# Altium footprint library GyokuRe.PcbLib: 1248 footprints (part 60 of 78)
Each footprint in its own frame and in the unit in brackets; x right, y up, seen from the top. Pads: shape width x height; smd on the part's side, far side on the other; paste and mask are expansions set on the pad; w line width, h text height; cw(c..) or ccw(c..) is an arc to the next point about the centre after c.
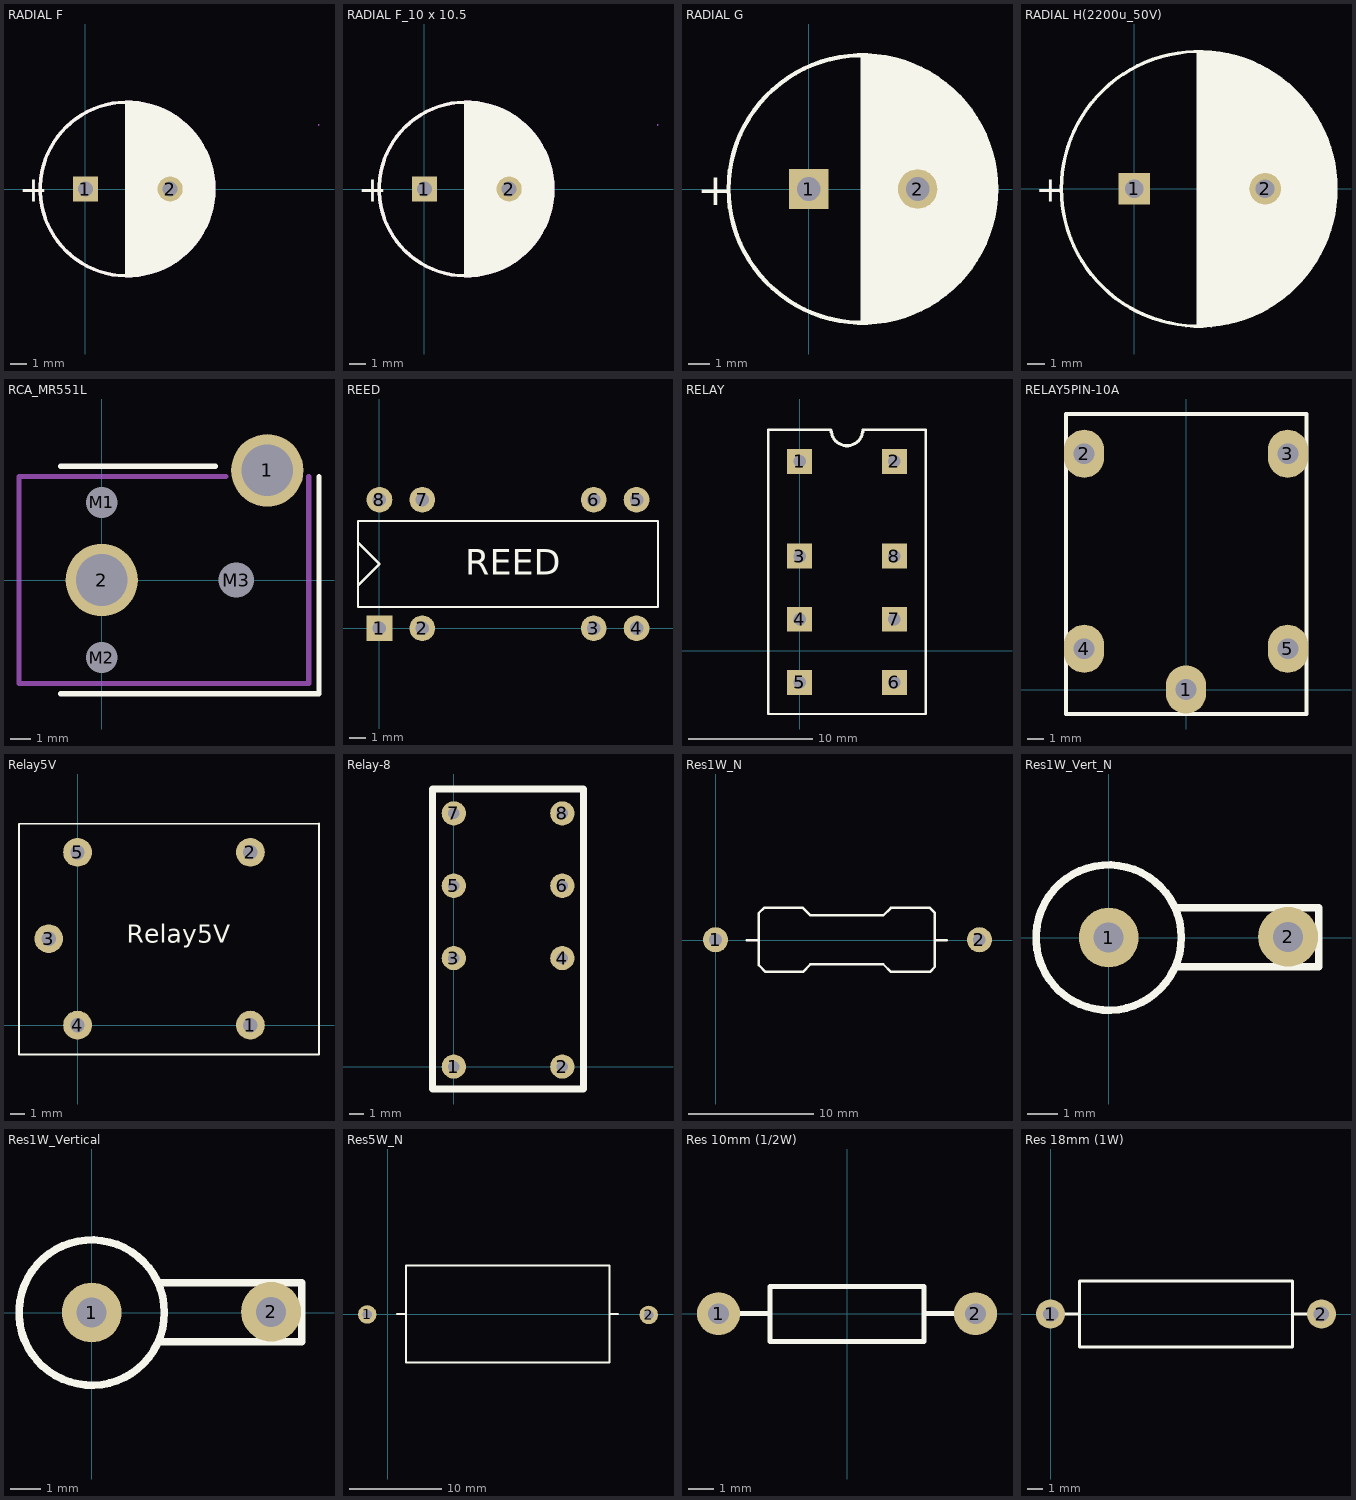
[diagram p59: the footprints below, top view; thin cyan lines are the x and y axes]

## RADIAL F [mm] "Capacitor, Electrolytic, Radial; Body 10 x 10.5 mm (Dia.xH typ); Pin Spacing 5 mm (typ)"
height 11.5
pads (2):
  rect 1.5x1.5 hole 0.9: 1(0,0)
  round 1.5 hole 0.9: 2(5.08,0)
Top Overlay:
  circle w0.2: c2.5,0 r5.207
  region: 2.489,-5.182 3.607,-5.08 4.826,-4.674 5.969,-3.835 7.01,-2.718 7.468,-1.6 7.747,-0.102 7.544,1.372 6.934,2.718 6.274,3.581 5.08,4.547 3.607,5.105 2.515,5.207 2.489,5.207
  lines w0.2: 2.489,5.182 2.489,-5.207 2.54,-5.207
  text "+" at -3.975,-0.75 h1.5
Bottom Overlay:
  circle w0.2: c2.5,0 r5.207
Mechanical 3:
  circle w0.025: c13.97,3.835 r0.025
Mechanical 13:
  circle w0.2: c2.5,0 r5.207
3D body: height 11.48, standoff 0.03, extent -2.54,-5.08 7.5,5.08
3D body: height 11.48, standoff 0.03, extent 7.239,-1.575 7.544,1.245
3D body: height 11.51, standoff 11.46, extent -1.401,-3.785 6.244,3.81
3D body: height 3, standoff 0, extent -0.25,-0.246 0.25,0.254
3D body: height 2, standoff 0, extent 4.83,-0.246 5.33,0.254

## RADIAL F_10 x 10.5 [mm] "Capacitor, Electrolytic, Radial; Body 10 x 10.5 mm (Dia.xH typ); Pin Spacing 5 mm (typ)"
height 11.5
pads (2):
  rect 1.5x1.5 hole 0.9: 1(0,0)
  round 1.5 hole 0.9: 2(5.08,0)
Top Overlay:
  circle w0.2: c2.5,0 r5.207
  region: 2.489,-5.182 3.607,-5.08 4.826,-4.674 5.969,-3.835 7.01,-2.718 7.468,-1.6 7.747,-0.102 7.544,1.372 6.934,2.718 6.274,3.581 5.08,4.547 3.607,5.105 2.515,5.207 2.489,5.207
  lines w0.2: 2.489,5.182 2.489,-5.207 2.54,-5.207
  text "+" at -3.975,-0.75 h1.5
Bottom Overlay:
  circle w0.2: c2.5,0 r5.207
Mechanical 3:
  circle w0.025: c13.97,3.835 r0.025
Mechanical 13:
  circle w0.2: c2.5,0 r5.207
3D body "CAP 10X20.STEP": height 19.99, standoff -19, extent -2.405,-5.004 7.595,4.996

## RADIAL G [mm] "Capacitor, Electrolytic, Radial; Body 12.5 x 22 mm (Dia.xH typ); Pin Spacing 5 mm (typ)"
height 23
pads (2):
  rect 1.85x1.85 hole 1.1: 1(0,0)
  round 1.85 hole 1.1: 2(5.08,0)
Top Overlay:
  circle w0.2: c2.5,0 r6.25
  region: 2.515,6.248 4.013,6.071 5.715,5.334 6.858,4.496 7.722,3.48 8.382,2.108 8.788,0.229 8.585,-1.448 7.95,-2.972 7.163,-4.14 6.071,-5.156 4.216,-6.02 2.489,-6.248
  lines w0.2: 2.515,-6.223 2.515,6.248
  text "+" at -5.225,-0.75 h1.5
Bottom Overlay:
  circle w0.2: c2.5,0 r6.25
  text "+" at -0.6,1.55 h1.5
3D body "Cap12_5x20.STEP": height 20.99, standoff -18, extent -3.658,-6.274 8.842,6.226

## RADIAL H(2200u_50V) [mm] "Capacitor, Electrolytic, Radial; Body 16 x 25 mm (Dia.xH typ); Pin Spacing 7.5 mm (typ)"
height 26
pads (2):
  rect 1.85x1.85 hole 1.1: 1(0,0)
  round 1.85 hole 1.1: 2(7.62,0)
Top Overlay:
  circle w0.2: c3.75,0 r8
  region: 3.759,7.976 5.41,7.823 7.264,7.137 8.941,6.121 10.516,4.242 11.608,1.753 11.735,-0.254 11.379,-2.337 10.719,-3.962 9.525,-5.563 8.052,-6.782 6.248,-7.645 4.445,-8.026 3.734,-7.95 3.734,8.001
  lines w0.2: 3.734,-7.976 3.734,7.976
  text "+" at -5.725,-0.75 h1.5
Bottom Overlay:
  circle w0.2: c3.75,0 r8
  text "+" at 1.895,-0.75 h1.5
3D body: height 32.12, standoff 0.09, extent 9.075,-3.15 11.85,3.025
3D body: height 32.01, standoff 0.11, extent -2.075,-5.775 9.55,5.775
3D body: height 32, standoff 0.1, extent -4.25,-8.025 11.825,8

## RCA_MR551L [mm] "Schurter RCA PCB Socket (Farnell 152-396)"
pads (5):
  round 3.5 hole 2.5: 1(8,5.3) 2(0,0)
  round 1.3 hole 1.5 unplated: M1(0,3.75) M2(0,-3.75)
  round 1.5 hole 1.7 unplated: M3(6.5,0)
Top Overlay:
  lines w0.254: -2,-5.5 10.5,-5.5 10.5,5 ; -2,5.5 5.5,5.5
Mechanical 1:
  lines w0.254: 6,5 -4,5 -4,-5 10,-5 10,5

## REED [mil]
pads (8):
  rect 60x60 hole 31.49: 1(0,0)
  round 60 hole 31.49: 2(100,0) 3(500,0) 4(600,0) 5(600,300) 6(500,300) 7(100,300) 8(0,300)
Top Overlay:
  lines w5: -50,100 0,150 -50,200 ; -50,50 650,50 650,250 -50,250 -50,50
  text "REED" at 200,125 h60

## RELAY [mm]
pads (8):
  rect 2x2 hole 1: 1(0,15.24) 2(7.62,15.24) 3(0,7.62) 4(0,2.54) 5(0,-2.54) 6(7.62,-2.54) 7(7.62,2.54) 8(7.62,7.62)
Top Overlay:
  lines w0.2: 2.413,17.78 -2.54,17.78 -2.54,-5.08 10.16,-5.08 10.16,17.78 5.08,17.78
  lines w0.254: 2.534,17.78 ccw(c3.81,17.78) 5.086,17.78
3D body "User Library-8PIN-Relay.step": height 12.3, standoff -3, extent -1.09,-4.05 8.71,16.75

## RELAY5PIN-10A [mm]
pads (5):
  oval 2.5x3 hole 1.3: 1(0,0) 2(-6.35,14.7) 3(6.35,14.7) 4(-6.35,2.54) 5(6.35,2.54)
Top Overlay:
  lines w0.254: -7.493,-1.524 7.507,-1.524 7.507,17.176 -7.493,17.176 -7.493,-1.524
3D body: height 16, standoff 0, extent -7.493,-1.524 7.493,17.145

## Relay5V [mm]
pads (5):
  round 2 hole 1 unplated: 1(12,0) 2(12,12) 3(-2,6) 4(0,0) 5(0,12)
Top Overlay:
  lines w0.127: -4.064,-2.032 16.764,-2.032 16.764,13.992 -4.064,13.957 -4.064,-2.032
  text "Relay5V" at 3.429,5.715 h1.27

## Relay-8 [mil] "Relay; 8 Leads; Solder Pad 35mil"
pads (8):
  round 67 hole 32: 1(0,0) 2(300,0) 3(0,300) 4(300,300) 5(0,500) 6(300,500) 7(0,700) 8(300,700)
Top Overlay:
  lines w19.68: -58.5,-62 -58.5,767.5 358,767.5 358,-62 -58.5,-62
3D body "User Library-OMRON G5V-2 - Relay Chico.step": height 453.15, standoff -157.28, extent -47,-51.04 346.7,756.04

## Res1W_N [mm]
pads (2):
  round 2 hole 1: 1(-0.025,0.051) 2(21,0.051)
Top Overlay:
  lines w0.2: 2.473,0 3.423,0 3.423,-1.975 3.948,-2.5 6.929,-2.5 7.529,-1.9 13.342,-1.9 13.942,-2.5 17.048,-2.5 17.448,-2.1 17.448,2.2 17.048,2.6 13.942,2.6 13.342,2 7.529,2 6.929,2.6 3.848,2.6 3.423,2.175 3.423,-0.025 ; 17.473,0 18.398,0
Bottom Overlay:
  lines w0.254: -1.5,-2.574 22.403,-2.574 22.403,2.801 -1.5,2.801 -1.5,-2.574
3D body "AXIAL_RESISTOR(3W).STEP": height 8.3, standoff -2, extent -0.61,-3.327 21.59,3.273

## Res1W_Vert_N [mm] "Res 8mm*2mm"
pads (2):
  round 2 hole 1: 1(0,0) 2(6,0.025)
Top Overlay:
  circle w0.254: c0,0 r2.43
  lines w0.254: 2.225,-0.975 7.025,-0.975 7.025,1 2.225,1
Bottom Overlay:
  lines w0.254: -1.425,2 7.6,2 7.6,-2.525 -1.575,-2.525 -1.575,2 -1.125,2
3D body "AXIAL_RESISTOR(3W_VERT).STEP": height 25.05, standoff -1.1, extent -1.736,-3.277 6.664,3.323

## Res1W_Vertical [mm] "Res 8mm*2mm"
pads (2):
  round 2 hole 1: 1(0,0) 2(6,0.025)
Top Overlay:
  circle w0.254: c0,0 r2.43
  lines w0.254: 2.225,-0.975 7.025,-0.975 7.025,1 2.225,1
Bottom Overlay:
  lines w0.254: -1.425,2 7.6,2 7.6,-2.525 -1.575,-2.525 -1.575,2 -1.125,2
3D body: height 12.5, standoff 11.5, extent 0.1,-0.474 6.1,0.524
3D body: height 5.8, standoff 5, extent -2.465,-2.475 2.515,2.515
3D body: height 9.8, standoff 9, extent -2.515,-2.465 2.465,2.525
3D body: height 9.25, standoff 1.25, extent -2.4,-2.37 2.381,2.42
3D body: height 5, standoff 0, extent -2.487,-2.475 2.487,2.504
3D body: height 11.75, standoff 6.75, extent -2.487,-2.475 2.487,2.504
3D body: height 7.8, standoff 7, extent -2.515,-2.465 2.465,2.525
3D body: height 3.8, standoff 3, extent -2.48,-2.495 2.5,2.495
3D body: height 11, standoff -1, extent 5.525,-0.474 6.521,0.524
3D body: height 0, standoff -1, extent -0.521,-0.499 0.475,0.499

## Res5W_N [mm] "Kich thuoc 22(mm) * 10(mm)"
height 10
pads (2):
  round 2 / inner round 1.2 / far side round 2 hole 1: 1(-2.21,-0.051) 2(28.296,-0.102)
Top Overlay:
  lines w0.2: 1.025,0 1.975,0 1.975,-5.25 24.025,-5.25 24.025,5.25 2,5.25 ; 1.975,-0.025 1.975,5.225 ; 24.025,0 24.95,0
Bottom Overlay:
  lines w0.254: 26.975,5.025 27.6,5.025 27.6,-5 -1.5,-5 -1.5,5.025 27.025,5.025
3D body "Res5W.STEP": height 9.35, standoff -1.85, extent -2.483,-3.48 28.797,3.52

## Res 10mm (1/2W) [mil] "Resistor; 2 Leads; 1/2W; Solder Pad 35mil"
height 80
pads (2):
  round 67 hole 32: 1(-200,0) 2(200,0)
Top Overlay:
  lines w7.87: -200,0 -120,0 ; 120,0 200,0 ; -120,-43 -120,42 120,42 120,-43 -120,-43
3D body "SW3dPS-RESISTOR, 0.25 W, 0.4 IN LEAD PITCH.STEP": height 95.5, standoff -120, extent -212,-46 212,45

## Res 18mm (1W) [mil] "Resistor; 2 Leads; 1W; Solder Pad 35mil"
height 80
pads (2):
  round 75 hole 40: 1(0,0) 2(700,0)
Top Overlay:
  lines w7.87: 0,0 75,0 ; 625,0 700,0 ; 75,-85 75,85 625,85 625,-85 75,-85
3D body "Resistor 1W.STEP": height 181.85, standoff -178.74, extent -15.74,-84.73 715.75,85.26